# Altium footprint library ref-packages-longpad.PCBLIB: 1527 footprints (part 74 of 103)
Each footprint in its own frame and in the unit in brackets; x right, y up, seen from the top. Pads: shape width x height; smd on the part's side, far side on the other; paste and mask are expansions set on the pad; w line width, h text height; cw(c..) or ccw(c..) is an arc to the next point about the centre after c.
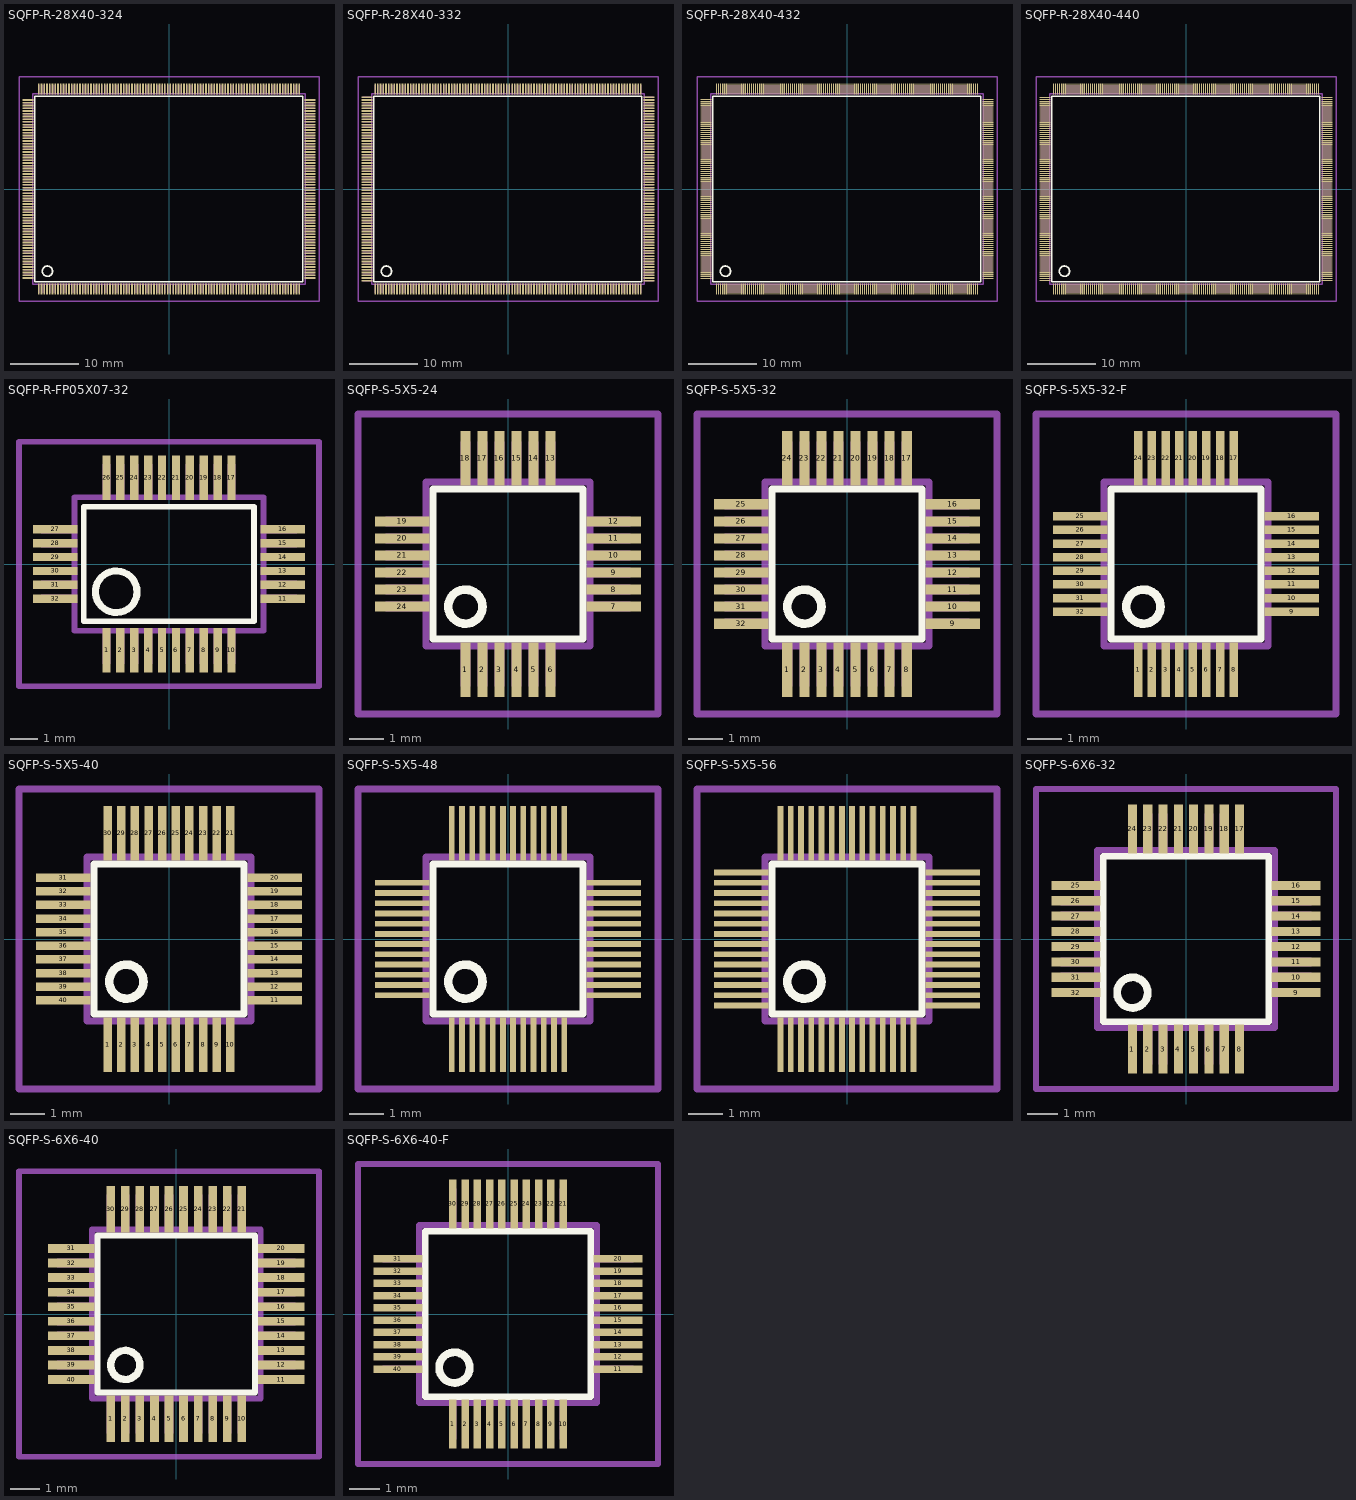
[diagram p73: the footprints below, top view; thin cyan lines are the x and y axes]

## SQFP-R-28X40-324 [mm]
pads (324):
  rect 0.25x1.6 smd: 1(-19,-14.6) 2(-18.6,-14.6) 3(-18.2,-14.6) 4(-17.8,-14.6) 5(-17.4,-14.6) 6(-17,-14.6) 7(-16.6,-14.6) 8(-16.2,-14.6) 9(-15.8,-14.6) 10(-15.4,-14.6) 11(-15,-14.6) 12(-14.6,-14.6) 13(-14.2,-14.6) 14(-13.8,-14.6) 15(-13.4,-14.6) 16(-13,-14.6) 17(-12.6,-14.6) 18(-12.2,-14.6) 19(-11.8,-14.6) 20(-11.4,-14.6) 21(-11,-14.6) 22(-10.6,-14.6) 23(-10.2,-14.6) 24(-9.8,-14.6) 25(-9.4,-14.6) 26(-9,-14.6) 27(-8.6,-14.6) 28(-8.2,-14.6) 29(-7.8,-14.6) 30(-7.4,-14.6) 31(-4.6,-14.6) 32(-7,-14.6) 33(-6.6,-14.6) 34(-6.2,-14.6) 35(-5.8,-14.6) 36(-5.4,-14.6) 37(-5,-14.6) 38(-4.2,-14.6) 39(-3.8,-14.6) 40(-3.4,-14.6) 41(-3,-14.6) 42(-2.6,-14.6) 43(-2.2,-14.6) 44(-1.8,-14.6) 45(-1.4,-14.6) 46(-1,-14.6) 47(-0.6,-14.6) 48(-0.2,-14.6) 49(0.2,-14.6) 50(0.6,-14.6) 51(1,-14.6) 52(1.4,-14.6) 53(1.8,-14.6) 54(2.2,-14.6) 55(2.6,-14.6) 56(3,-14.6) 57(3.4,-14.6) 58(3.8,-14.6) 59(4.2,-14.6) 60(4.6,-14.6) 61(5,-14.6) 62(5.4,-14.6) 63(5.8,-14.6) 64(6.2,-14.6) 65(6.6,-14.6) 66(7,-14.6) 67(7.4,-14.6) 68(7.8,-14.6) 69(8.2,-14.6) 70(8.6,-14.6) 71(9,-14.6) 72(9.4,-14.6) 73(9.8,-14.6) 74(10.2,-14.6) 75(10.6,-14.6) 76(11,-14.6) 77(11.4,-14.6) 78(11.8,-14.6) 79(12.2,-14.6) 80(12.6,-14.6) 81(13,-14.6) 82(13.4,-14.6) 83(13.8,-14.6) 84(14.2,-14.6) 85(14.6,-14.6) 86(15,-14.6) 87(15.4,-14.6) 88(15.8,-14.6) 89(16.2,-14.6) 90(16.6,-14.6) 91(17,-14.6) 92(17.4,-14.6) 93(17.8,-14.6) 94(18.2,-14.6) 95(18.6,-14.6) 96(19,-14.6) 163(19,14.6) 164(18.6,14.6) 165(18.2,14.6) 166(17.8,14.6) 167(17.4,14.6) 168(17,14.6) 169(16.6,14.6) 170(16.2,14.6) 171(15.8,14.6) 172(15.4,14.6) 173(15,14.6) 174(14.6,14.6) 175(14.2,14.6) 176(13.8,14.6) 177(13.4,14.6) 178(13,14.6) 179(12.6,14.6) 180(12.2,14.6) 181(11.8,14.6) 182(11.4,14.6) 183(11,14.6) 184(10.6,14.6) 185(10.2,14.6) 186(9.8,14.6) 187(9.4,14.6) 188(9,14.6) 189(8.6,14.6) 190(8.2,14.6) 191(7.8,14.6) 192(7.4,14.6) 193(7,14.6) 194(6.6,14.6) 195(6.2,14.6) 196(5.8,14.6) 197(5.4,14.6) 198(5,14.6) 199(4.6,14.6) 200(4.2,14.6) 201(3.8,14.6) 202(3.4,14.6) 203(3,14.6) 204(2.6,14.6) 205(2.2,14.6) 206(1.8,14.6) 207(1.4,14.6) 208(1,14.6) 209(0.6,14.6) 210(0.2,14.6) 211(-0.2,14.6) 212(-0.6,14.6) 213(-1,14.6) 214(-1.4,14.6) 215(-1.8,14.6) 216(-2.2,14.6) 217(-2.6,14.6) 218(-3,14.6) 219(-3.4,14.6) 220(-3.8,14.6) 221(-4.2,14.6) 222(-4.6,14.6) 223(-5,14.6) 224(-5.4,14.6) 225(-5.8,14.6) 226(-6.2,14.6) 227(-6.6,14.6) 228(-7,14.6) 229(-7.4,14.6) 230(-7.8,14.6) 231(-8.2,14.6) 232(-8.6,14.6) 233(-9,14.6) 234(-9.4,14.6) 235(-9.8,14.6) 236(-10.2,14.6) 237(-10.6,14.6) 238(-11,14.6) 239(-11.4,14.6) 240(-11.8,14.6) 241(-12.2,14.6) 242(-12.6,14.6) 243(-13,14.6) 244(-13.4,14.6) 245(-13.8,14.6) 246(-14.2,14.6) 247(-14.6,14.6) 248(-15,14.6) 249(-15.4,14.6) 250(-15.8,14.6) 251(-16.2,14.6) 252(-16.6,14.6) 253(-17,14.6) 254(-17.4,14.6) 255(-17.8,14.6) 256(-18.2,14.6) 257(-18.6,14.6) 258(-19,14.6)
  rect 1.6x0.25 smd: 97(20.6,-13) 98(20.6,-12.6) 99(20.6,-12.2) 100(20.6,-11.8) 101(20.6,-11.4) 102(20.6,-11) 103(20.6,-10.6) 104(20.6,-10.2) 105(20.6,-9.8) 106(20.6,-9.4) 107(20.6,-9) 108(20.6,-8.6) 109(20.6,-8.2) 110(20.6,-7.8) 111(20.6,-7.4) 112(20.6,-7) 113(20.6,-6.6) 114(20.6,-6.2) 115(20.6,-5.8) 116(20.6,-5.4) 117(20.6,-5) 118(20.6,-4.6) 119(20.6,-4.2) 120(20.6,-3.8) 121(20.6,-3.4) 122(20.6,-3) 123(20.6,-2.6) 124(20.6,-2.2) 125(20.6,-1.8) 126(20.6,-1.4) 127(20.6,-1) 128(20.6,-0.6) 129(20.6,-0.2) 130(20.6,0.2) 131(20.6,0.6) 132(20.6,1) 133(20.6,1.4) 134(20.6,1.8) 135(20.6,2.2) 136(20.6,2.6) 137(20.6,3) 138(20.6,3.4) 139(20.6,3.8) 140(20.6,4.2) 141(20.6,4.6) 142(20.6,5) 143(20.6,5.4) 144(20.6,5.8) 145(20.6,6.2) 146(20.6,6.6) 147(20.6,7) 148(20.6,7.4) 149(20.6,7.8) 150(20.6,8.2) 151(20.6,8.6) 152(20.6,9) 153(20.6,9.4) 154(20.6,9.8) 155(20.6,10.2) 156(20.6,10.6) 157(20.6,11) 158(20.6,11.4) 159(20.6,11.8) 160(20.6,12.2) 161(20.6,12.6) 162(20.6,13) 259(-20.6,13) 260(-20.6,12.6) 261(-20.6,12.2) 262(-20.6,11.8) 263(-20.6,11.4) 264(-20.6,11) 265(-20.6,10.6) 266(-20.6,10.2) 267(-20.6,9.8) 268(-20.6,9.4) 269(-20.6,9) 270(-20.6,8.6) 271(-20.6,8.2) 272(-20.6,7.8) 273(-20.6,7.4) 274(-20.6,7) 275(-20.6,6.6) 276(-20.6,6.2) 277(-20.6,5.8) 278(-20.6,5.4) 279(-20.6,5) 280(-20.6,4.6) 281(-20.6,4.2) 282(-20.6,3.8) 283(-20.6,3.4) 284(-20.6,3) 285(-20.6,2.6) 286(-20.6,2.2) 287(-20.6,1.8) 288(-20.6,1.4) 289(-20.6,1) 290(-20.6,0.6) 291(-20.6,0.2) 292(-20.6,-0.2) 293(-20.6,-0.6) 294(-20.6,-1) 295(-20.6,-1.4) 296(-20.6,-1.8) 297(-20.6,-2.2) 298(-20.6,-2.6) 299(-20.6,-3) 300(-20.6,-3.4) 301(-20.6,-3.8) 302(-20.6,-4.2) 303(-20.6,-4.6) 304(-20.6,-5) 305(-20.6,-5.4) 306(-20.6,-5.8) 307(-20.6,-6.2) 308(-20.6,-6.6) 309(-20.6,-7) 310(-20.6,-7.4) 311(-20.6,-7.8) 312(-20.6,-8.2) 313(-20.6,-8.6) 314(-20.6,-9) 315(-20.6,-9.4) 316(-20.6,-9.8) 317(-20.6,-10.2) 318(-20.6,-10.6) 319(-20.6,-11) 320(-20.6,-11.4) 321(-20.6,-11.8) 322(-20.6,-12.2) 323(-20.6,-12.6) 324(-20.6,-13)
Top Overlay:
  circle w0.254: c-17.75,-12 r0.75
  lines w0.203: -19.57,-13.56 19.56,-13.56 19.56,13.56 -19.57,13.56 -19.57,-13.56
Mechanical 16:
  drawing of 328 lines, arcs and shapes, not listed
Mechanical 27:
  lines w0.2: -21.9,-16.4 -21.9,16.4 21.9,16.4 21.9,-16.4 -21.9,-16.4

## SQFP-R-28X40-332 [mm]
pads (332):
  rect 0.25x1.6 smd: 1(-19.4,-14.6) 2(-19,-14.6) 3(-18.6,-14.6) 4(-18.2,-14.6) 5(-17.8,-14.6) 6(-17.4,-14.6) 7(-17,-14.6) 8(-16.6,-14.6) 9(-16.2,-14.6) 10(-15.8,-14.6) 11(-15.4,-14.6) 12(-15,-14.6) 13(-14.6,-14.6) 14(-14.2,-14.6) 15(-13.8,-14.6) 16(-13.4,-14.6) 17(-13,-14.6) 18(-12.6,-14.6) 19(-12.2,-14.6) 20(-11.8,-14.6) 21(-11.4,-14.6) 22(-11,-14.6) 23(-10.6,-14.6) 24(-10.2,-14.6) 25(-9.8,-14.6) 26(-9.4,-14.6) 27(-9,-14.6) 28(-8.6,-14.6) 29(-8.2,-14.6) 30(-7.8,-14.6) 31(-5,-14.6) 32(-7.4,-14.6) 33(-7,-14.6) 34(-6.6,-14.6) 35(-6.2,-14.6) 36(-5.8,-14.6) 37(-5.4,-14.6) 38(-4.6,-14.6) 39(-4.2,-14.6) 40(-3.8,-14.6) 41(-3.4,-14.6) 42(-3,-14.6) 43(-2.6,-14.6) 44(-2.2,-14.6) 45(-1.8,-14.6) 46(-1.4,-14.6) 47(-1,-14.6) 48(-0.6,-14.6) 49(-0.2,-14.6) 50(0.2,-14.6) 51(0.6,-14.6) 52(1,-14.6) 53(1.4,-14.6) 54(1.8,-14.6) 55(2.2,-14.6) 56(2.6,-14.6) 57(3,-14.6) 58(3.4,-14.6) 59(3.8,-14.6) 60(4.2,-14.6) 61(4.6,-14.6) 62(5,-14.6) 63(5.4,-14.6) 64(5.8,-14.6) 65(6.2,-14.6) 66(6.6,-14.6) 67(7,-14.6) 68(7.4,-14.6) 69(7.8,-14.6) 70(8.2,-14.6) 71(8.6,-14.6) 72(9,-14.6) 73(9.4,-14.6) 74(9.8,-14.6) 75(10.2,-14.6) 76(10.6,-14.6) 77(11,-14.6) 78(11.4,-14.6) 79(11.8,-14.6) 80(12.2,-14.6) 81(12.6,-14.6) 82(13,-14.6) 83(13.4,-14.6) 84(13.8,-14.6) 85(14.2,-14.6) 86(14.6,-14.6) 87(15,-14.6) 88(15.4,-14.6) 89(15.8,-14.6) 90(16.2,-14.6) 91(16.6,-14.6) 92(17,-14.6) 93(17.4,-14.6) 94(17.8,-14.6) 95(18.2,-14.6) 96(18.6,-14.6) 97(19,-14.6) 98(19.4,-14.6) 167(19.4,14.6) 168(19,14.6) 169(18.6,14.6) 170(18.2,14.6) 171(17.8,14.6) 172(17.4,14.6) 173(17,14.6) 174(16.6,14.6) 175(16.2,14.6) 176(15.8,14.6) 177(15.4,14.6) 178(15,14.6) 179(14.6,14.6) 180(14.2,14.6) 181(13.8,14.6) 182(13.4,14.6) 183(13,14.6) 184(12.6,14.6) 185(12.2,14.6) 186(11.8,14.6) 187(11.4,14.6) 188(11,14.6) 189(10.6,14.6) 190(10.2,14.6) 191(9.8,14.6) 192(9.4,14.6) 193(9,14.6) 194(8.6,14.6) 195(8.2,14.6) 196(7.8,14.6) 197(7.4,14.6) 198(7,14.6) 199(6.6,14.6) 200(6.2,14.6) 201(5.8,14.6) 202(5.4,14.6) 203(5,14.6) 204(4.6,14.6) 205(4.2,14.6) 206(3.8,14.6) 207(3.4,14.6) 208(3,14.6) 209(2.6,14.6) 210(2.2,14.6) 211(1.8,14.6) 212(1.4,14.6) 213(1,14.6) 214(0.6,14.6) 215(0.2,14.6) 216(-0.2,14.6) 217(-0.6,14.6) 218(-1,14.6) 219(-1.4,14.6) 220(-1.8,14.6) 221(-2.2,14.6) 222(-2.6,14.6) 223(-3,14.6) 224(-3.4,14.6) 225(-3.8,14.6) 226(-4.2,14.6) 227(-4.6,14.6) 228(-5,14.6) 229(-5.4,14.6) 230(-5.8,14.6) 231(-6.2,14.6) 232(-6.6,14.6) 233(-7,14.6) 234(-7.4,14.6) 235(-7.8,14.6) 236(-8.2,14.6) 237(-8.6,14.6) 238(-9,14.6) 239(-9.4,14.6) 240(-9.8,14.6) 241(-10.2,14.6) 242(-10.6,14.6) 243(-11,14.6) 244(-11.4,14.6) 245(-11.8,14.6) 246(-12.2,14.6) 247(-12.6,14.6) 248(-13,14.6) 249(-13.4,14.6) 250(-13.8,14.6) 251(-14.2,14.6) 252(-14.6,14.6) 253(-15,14.6) 254(-15.4,14.6) 255(-15.8,14.6) 256(-16.2,14.6) 257(-16.6,14.6) 258(-17,14.6) 259(-17.4,14.6) 260(-17.8,14.6) 261(-18.2,14.6) 262(-18.6,14.6) 263(-19,14.6) 264(-19.4,14.6)
  rect 1.6x0.25 smd: 99(20.6,-13.4) 100(20.6,-13) 101(20.6,-12.6) 102(20.6,-12.2) 103(20.6,-11.8) 104(20.6,-11.4) 105(20.6,-11) 106(20.6,-10.6) 107(20.6,-10.2) 108(20.6,-9.8) 109(20.6,-9.4) 110(20.6,-9) 111(20.6,-8.6) 112(20.6,-8.2) 113(20.6,-7.8) 114(20.6,-7.4) 115(20.6,-7) 116(20.6,-6.6) 117(20.6,-6.2) 118(20.6,-5.8) 119(20.6,-5.4) 120(20.6,-5) 121(20.6,-4.6) 122(20.6,-4.2) 123(20.6,-3.8) 124(20.6,-3.4) 125(20.6,-3) 126(20.6,-2.6) 127(20.6,-2.2) 128(20.6,-1.8) 129(20.6,-1.4) 130(20.6,-1) 131(20.6,-0.6) 132(20.6,-0.2) 133(20.6,0.2) 134(20.6,0.6) 135(20.6,1) 136(20.6,1.4) 137(20.6,1.8) 138(20.6,2.2) 139(20.6,2.6) 140(20.6,3) 141(20.6,3.4) 142(20.6,3.8) 143(20.6,4.2) 144(20.6,4.6) 145(20.6,5) 146(20.6,5.4) 147(20.6,5.8) 148(20.6,6.2) 149(20.6,6.6) 150(20.6,7) 151(20.6,7.4) 152(20.6,7.8) 153(20.6,8.2) 154(20.6,8.6) 155(20.6,9) 156(20.6,9.4) 157(20.6,9.8) 158(20.6,10.2) 159(20.6,10.6) 160(20.6,11) 161(20.6,11.4) 162(20.6,11.8) 163(20.6,12.2) 164(20.6,12.6) 165(20.6,13) 166(20.6,13.4) 265(-20.6,13.4) 266(-20.6,13) 267(-20.6,12.6) 268(-20.6,12.2) 269(-20.6,11.8) 270(-20.6,11.4) 271(-20.6,11) 272(-20.6,10.6) 273(-20.6,10.2) 274(-20.6,9.8) 275(-20.6,9.4) 276(-20.6,9) 277(-20.6,8.6) 278(-20.6,8.2) 279(-20.6,7.8) 280(-20.6,7.4) 281(-20.6,7) 282(-20.6,6.6) 283(-20.6,6.2) 284(-20.6,5.8) 285(-20.6,5.4) 286(-20.6,5) 287(-20.6,4.6) 288(-20.6,4.2) 289(-20.6,3.8) 290(-20.6,3.4) 291(-20.6,3) 292(-20.6,2.6) 293(-20.6,2.2) 294(-20.6,1.8) 295(-20.6,1.4) 296(-20.6,1) 297(-20.6,0.6) 298(-20.6,0.2) 299(-20.6,-0.2) 300(-20.6,-0.6) 301(-20.6,-1) 302(-20.6,-1.4) 303(-20.6,-1.8) 304(-20.6,-2.2) 305(-20.6,-2.6) 306(-20.6,-3) 307(-20.6,-3.4) 308(-20.6,-3.8) 309(-20.6,-4.2) 310(-20.6,-4.6) 311(-20.6,-5) 312(-20.6,-5.4) 313(-20.6,-5.8) 314(-20.6,-6.2) 315(-20.6,-6.6) 316(-20.6,-7) 317(-20.6,-7.4) 318(-20.6,-7.8) 319(-20.6,-8.2) 320(-20.6,-8.6) 321(-20.6,-9) 322(-20.6,-9.4) 323(-20.6,-9.8) 324(-20.6,-10.2) 325(-20.6,-10.6) 326(-20.6,-11) 327(-20.6,-11.4) 328(-20.6,-11.8) 329(-20.6,-12.2) 330(-20.6,-12.6) 331(-20.6,-13) 332(-20.6,-13.4)
Top Overlay:
  circle w0.254: c-17.75,-12 r0.75
  lines w0.203: -19.57,-13.56 19.56,-13.56 19.56,13.56 -19.57,13.56 -19.57,-13.56
Mechanical 16:
  drawing of 336 lines, arcs and shapes, not listed
Mechanical 27:
  lines w0.2: -21.9,-16.4 -21.9,16.4 21.9,16.4 21.9,-16.4 -21.9,-16.4

## SQFP-R-28X40-432 [mm]
pads (432):
  rect 0.17x1.6 smd: 1(-19.05,-14.6) 2(-18.75,-14.6) 3(-18.45,-14.6) 4(-18.15,-14.6) 5(-17.85,-14.6) 6(-17.55,-14.6) 7(-17.25,-14.6) 8(-16.95,-14.6) 9(-16.65,-14.6) 10(-16.35,-14.6) 11(-16.05,-14.6) 12(-15.75,-14.6) 13(-15.45,-14.6) 14(-15.15,-14.6) 15(-14.85,-14.6) 16(-14.55,-14.6) 17(-14.25,-14.6) 18(-13.95,-14.6) 19(-13.65,-14.6) 20(-13.35,-14.6) 21(-13.05,-14.6) 22(-12.75,-14.6) 23(-12.45,-14.6) 24(-12.15,-14.6) 25(-11.85,-14.6) 26(-11.55,-14.6) 27(-11.25,-14.6) 28(-10.95,-14.6) 29(-10.65,-14.6) 30(-10.35,-14.6) 31(-10.05,-14.6) 32(-9.75,-14.6) 33(-9.45,-14.6) 34(-9.15,-14.6) 35(-8.85,-14.6) 36(-8.55,-14.6) 37(-8.25,-14.6) 38(-7.95,-14.6) 39(-7.65,-14.6) 40(-7.35,-14.6) 41(-7.05,-14.6) 42(-6.75,-14.6) 43(-6.45,-14.6) 44(-6.15,-14.6) 45(-5.85,-14.6) 46(-5.55,-14.6) 47(-5.25,-14.6) 48(-4.95,-14.6) 49(-4.65,-14.6) 50(-4.35,-14.6) 51(-4.05,-14.6) 52(-3.75,-14.6) 53(-3.45,-14.6) 54(-3.15,-14.6) 55(-2.85,-14.6) 56(-2.55,-14.6) 57(-2.25,-14.6) 58(-1.95,-14.6) 59(-1.65,-14.6) 60(-1.35,-14.6) 61(-1.05,-14.6) 62(-0.75,-14.6) 63(-0.45,-14.6) 64(-0.15,-14.6) 65(0.15,-14.6) 66(0.45,-14.6) 67(0.75,-14.6) 68(1.05,-14.6) 69(1.35,-14.6) 70(1.65,-14.6) 71(1.95,-14.6) 72(2.25,-14.6) 73(2.55,-14.6) 74(2.85,-14.6) 75(3.15,-14.6) 76(3.45,-14.6) 77(3.75,-14.6) 78(4.05,-14.6) 79(4.35,-14.6) 80(4.65,-14.6) 81(4.95,-14.6) 82(5.25,-14.6) 83(5.55,-14.6) 84(5.85,-14.6) 85(6.15,-14.6) 86(6.45,-14.6) 87(6.75,-14.6) 88(7.05,-14.6) 89(7.35,-14.6) 90(7.65,-14.6) 91(7.95,-14.6) 92(8.25,-14.6) 93(8.55,-14.6) 94(8.85,-14.6) 95(9.15,-14.6) 96(9.45,-14.6) 97(9.75,-14.6) 98(10.05,-14.6) 99(10.35,-14.6) 100(10.65,-14.6) 101(10.95,-14.6) 102(11.25,-14.6) 103(11.55,-14.6) 104(11.85,-14.6) 105(12.15,-14.6) 106(12.45,-14.6) 107(12.75,-14.6) 108(13.05,-14.6) 109(13.35,-14.6) 110(13.65,-14.6) 111(13.95,-14.6) 112(14.25,-14.6) 113(14.55,-14.6) 114(14.85,-14.6) 115(15.15,-14.6) 116(15.45,-14.6) 117(15.75,-14.6) 118(16.05,-14.6) 119(16.35,-14.6) 120(16.65,-14.6) 121(16.95,-14.6) 122(17.25,-14.6) 123(17.55,-14.6) 124(17.85,-14.6) 125(18.15,-14.6) 126(18.45,-14.6) 127(18.75,-14.6) 128(19.05,-14.6) 217(19.05,14.6) 218(18.75,14.6) 219(18.45,14.6) 220(18.15,14.6) 221(17.85,14.6) 222(17.55,14.6) 223(17.25,14.6) 224(16.95,14.6) 225(16.65,14.6) 226(16.35,14.6) 227(16.05,14.6) 228(15.75,14.6) 229(15.45,14.6) 230(15.15,14.6) 231(14.85,14.6) 232(14.55,14.6) 233(14.25,14.6) 234(13.95,14.6) 235(13.65,14.6) 236(13.35,14.6) 237(13.05,14.6) 238(12.75,14.6) 239(12.45,14.6) 240(12.15,14.6) 241(11.85,14.6) 242(11.55,14.6) 243(11.25,14.6) 244(10.95,14.6) 245(10.65,14.6) 246(10.35,14.6) 247(10.05,14.6) 248(9.75,14.6) 249(9.45,14.6) 250(9.15,14.6) 251(8.85,14.6) 252(8.55,14.6) 253(8.25,14.6) 254(7.95,14.6) 255(7.65,14.6) 256(7.35,14.6) 257(7.05,14.6) 258(6.75,14.6) 259(6.45,14.6) 260(6.15,14.6) 261(5.85,14.6) 262(5.55,14.6) 263(5.25,14.6) 264(4.95,14.6) 265(4.65,14.6) 266(4.35,14.6) 267(4.05,14.6) 268(3.75,14.6) 269(3.45,14.6) 270(3.15,14.6) 271(2.85,14.6) 272(2.55,14.6) 273(2.25,14.6) 274(1.95,14.6) 275(1.65,14.6) 276(1.35,14.6) 277(1.05,14.6) 278(0.75,14.6) 279(0.45,14.6) 280(0.15,14.6) 281(-0.15,14.6) 282(-0.45,14.6) 283(-0.75,14.6) 284(-1.05,14.6) 285(-1.35,14.6) 286(-1.65,14.6) 287(-1.95,14.6) 288(-2.25,14.6) 289(-2.55,14.6) 290(-2.85,14.6) 291(-3.15,14.6) 292(-3.45,14.6) 293(-3.75,14.6) 294(-4.05,14.6) 295(-4.35,14.6) 296(-4.65,14.6) 297(-4.95,14.6) 298(-5.25,14.6) 299(-5.55,14.6) 300(-5.85,14.6) 301(-6.15,14.6) 302(-6.45,14.6) 303(-6.75,14.6) 304(-7.05,14.6) 305(-7.35,14.6) 306(-7.65,14.6) 307(-7.95,14.6) 308(-8.25,14.6) 309(-8.55,14.6) 310(-8.85,14.6) 311(-9.15,14.6) 312(-9.45,14.6) 313(-9.75,14.6) 314(-10.05,14.6) 315(-10.35,14.6) 316(-10.65,14.6) 317(-10.95,14.6) 318(-11.25,14.6) 319(-11.55,14.6) 320(-11.85,14.6) 321(-12.15,14.6) 322(-12.45,14.6) 323(-12.75,14.6) 324(-13.05,14.6) 325(-13.35,14.6) 326(-13.65,14.6) 327(-13.95,14.6) 328(-14.25,14.6) 329(-14.55,14.6) 330(-14.85,14.6) 331(-15.15,14.6) 332(-15.45,14.6) 333(-15.75,14.6) 334(-16.05,14.6) 335(-16.35,14.6) 336(-16.65,14.6) 337(-16.95,14.6) 338(-17.25,14.6) 339(-17.55,14.6) 340(-17.85,14.6) 341(-18.15,14.6) 342(-18.45,14.6) 343(-18.75,14.6) 344(-19.05,14.6)
  rect 1.6x0.17 smd: 129(20.6,-13.05) 130(20.6,-12.75) 131(20.6,-12.45) 132(20.6,-12.15) 133(20.6,-11.85) 134(20.6,-11.55) 135(20.6,-11.25) 136(20.6,-10.95) 137(20.6,-10.65) 138(20.6,-10.35) 139(20.6,-10.05) 140(20.6,-9.75) 141(20.6,-9.45) 142(20.6,-9.15) 143(20.6,-8.85) 144(20.6,-8.55) 145(20.6,-8.25) 146(20.6,-7.95) 147(20.6,-7.65) 148(20.6,-7.35) 149(20.6,-7.05) 150(20.6,-6.75) 151(20.6,-6.45) 152(20.6,-6.15) 153(20.6,-5.85) 154(20.6,-5.55) 155(20.6,-5.25) 156(20.6,-4.95) 157(20.6,-4.65) 158(20.6,-4.35) 159(20.6,-4.05) 160(20.6,-3.75) 161(20.6,-3.45) 162(20.6,-3.15) 163(20.6,-2.85) 164(20.6,-2.55) 165(20.6,-2.25) 166(20.6,-1.95) 167(20.6,-1.65) 168(20.6,-1.35) 169(20.6,-1.05) 170(20.6,-0.75) 171(20.6,-0.45) 172(20.6,-0.15) 173(20.6,0.15) 174(20.6,0.45) 175(20.6,0.75) 176(20.6,1.05) 177(20.6,1.35) 178(20.6,1.65) 179(20.6,1.95) 180(20.6,2.25) 181(20.6,2.55) 182(20.6,2.85) 183(20.6,3.15) 184(20.6,3.45) 185(20.6,3.75) 186(20.6,4.05) 187(20.6,4.35) 188(20.6,4.65) 189(20.6,4.95) 190(20.6,5.25) 191(20.6,5.55) 192(20.6,5.85) 193(20.6,6.15) 194(20.6,6.45) 195(20.6,6.75) 196(20.6,7.05) 197(20.6,7.35) 198(20.6,7.65) 199(20.6,7.95) 200(20.6,8.25) 201(20.6,8.55) 202(20.6,8.85) 203(20.6,9.15) 204(20.6,9.45) 205(20.6,9.75) 206(20.6,10.05) 207(20.6,10.35) 208(20.6,10.65) 209(20.6,10.95) 210(20.6,11.25) 211(20.6,11.55) 212(20.6,11.85) 213(20.6,12.15) 214(20.6,12.45) 215(20.6,12.75) 216(20.6,13.05) 345(-20.6,13.05) 346(-20.6,12.75) 347(-20.6,12.45) 348(-20.6,12.15) 349(-20.6,11.85) 350(-20.6,11.55) 351(-20.6,11.25) 352(-20.6,10.95) 353(-20.6,10.65) 354(-20.6,10.35) 355(-20.6,10.05) 356(-20.6,9.75) 357(-20.6,9.45) 358(-20.6,9.15) 359(-20.6,8.85) 360(-20.6,8.55) 361(-20.6,8.25) 362(-20.6,7.95) 363(-20.6,7.65) 364(-20.6,7.35) 365(-20.6,7.05) 366(-20.6,6.75) 367(-20.6,6.45) 368(-20.6,6.15) 369(-20.6,5.85) 370(-20.6,5.55) 371(-20.6,5.25) 372(-20.6,4.95) 373(-20.6,4.65) 374(-20.6,4.35) 375(-20.6,4.05) 376(-20.6,3.75) 377(-20.6,3.45) 378(-20.6,3.15) 379(-20.6,2.85) 380(-20.6,2.55) 381(-20.6,2.25) 382(-20.6,1.95) 383(-20.6,1.65) 384(-20.6,1.35) 385(-20.6,1.05) 386(-20.6,0.75) 387(-20.6,0.45) 388(-20.6,0.15) 389(-20.6,-0.15) 390(-20.6,-0.45) 391(-20.6,-0.75) 392(-20.6,-1.05) 393(-20.6,-1.35) 394(-20.6,-1.65) 395(-20.6,-1.95) 396(-20.6,-2.25) 397(-20.6,-2.55) 398(-20.6,-2.85) 399(-20.6,-3.15) 400(-20.6,-3.45) 401(-20.6,-3.75) 402(-20.6,-4.05) 403(-20.6,-4.35) 404(-20.6,-4.65) 405(-20.6,-4.95) 406(-20.6,-5.25) 407(-20.6,-5.55) 408(-20.6,-5.85) 409(-20.6,-6.15) 410(-20.6,-6.45) 411(-20.6,-6.75) 412(-20.6,-7.05) 413(-20.6,-7.35) 414(-20.6,-7.65) 415(-20.6,-7.95) 416(-20.6,-8.25) 417(-20.6,-8.55) 418(-20.6,-8.85) 419(-20.6,-9.15) 420(-20.6,-9.45) 421(-20.6,-9.75) 422(-20.6,-10.05) 423(-20.6,-10.35) 424(-20.6,-10.65) 425(-20.6,-10.95) 426(-20.6,-11.25) 427(-20.6,-11.55) 428(-20.6,-11.85) 429(-20.6,-12.15) 430(-20.6,-12.45) 431(-20.6,-12.75) 432(-20.6,-13.05)
Top Overlay:
  circle w0.254: c-17.75,-12 r0.75
  lines w0.203: -19.57,-13.56 19.56,-13.56 19.56,13.56 -19.57,13.56 -19.57,-13.56
Mechanical 16:
  drawing of 436 lines, arcs and shapes, not listed
Mechanical 27:
  lines w0.2: -21.9,-16.4 -21.9,16.4 21.9,16.4 21.9,-16.4 -21.9,-16.4

## SQFP-R-28X40-440 [mm]
pads (440):
  rect 0.17x1.6 smd: 1(-19.35,-14.6) 2(-19.05,-14.6) 3(-18.75,-14.6) 4(-18.45,-14.6) 5(-18.15,-14.6) 6(-17.85,-14.6) 7(-17.55,-14.6) 8(-17.25,-14.6) 9(-16.95,-14.6) 10(-16.65,-14.6) 11(-16.35,-14.6) 12(-16.05,-14.6) 13(-15.75,-14.6) 14(-15.45,-14.6) 15(-15.15,-14.6) 16(-14.85,-14.6) 17(-14.55,-14.6) 18(-14.25,-14.6) 19(-13.95,-14.6) 20(-13.65,-14.6) 21(-13.35,-14.6) 22(-13.05,-14.6) 23(-12.75,-14.6) 24(-12.45,-14.6) 25(-12.15,-14.6) 26(-11.85,-14.6) 27(-11.55,-14.6) 28(-11.25,-14.6) 29(-10.95,-14.6) 30(-10.65,-14.6) 31(-10.35,-14.6) 32(-10.05,-14.6) 33(-9.75,-14.6) 34(-9.45,-14.6) 35(-9.15,-14.6) 36(-8.85,-14.6) 37(-8.55,-14.6) 38(-8.25,-14.6) 39(-7.95,-14.6) 40(-7.65,-14.6) 41(-7.35,-14.6) 42(-7.05,-14.6) 43(-6.75,-14.6) 44(-6.45,-14.6) 45(-6.15,-14.6) 46(-5.85,-14.6) 47(-5.55,-14.6) 48(-5.25,-14.6) 49(-4.95,-14.6) 50(-4.65,-14.6) 51(-4.35,-14.6) 52(-4.05,-14.6) 53(-3.75,-14.6) 54(-3.45,-14.6) 55(-3.15,-14.6) 56(-2.85,-14.6) 57(-2.55,-14.6) 58(-2.25,-14.6) 59(-1.95,-14.6) 60(-1.65,-14.6) 61(-1.35,-14.6) 62(-1.05,-14.6) 63(-0.75,-14.6) 64(-0.45,-14.6) 65(-0.15,-14.6) 66(0.15,-14.6) 67(0.45,-14.6) 68(0.75,-14.6) 69(1.05,-14.6) 70(1.35,-14.6) 71(1.65,-14.6) 72(1.95,-14.6) 73(2.25,-14.6) 74(2.55,-14.6) 75(2.85,-14.6) 76(3.15,-14.6) 77(3.45,-14.6) 78(3.75,-14.6) 79(4.05,-14.6) 80(4.35,-14.6) 81(4.65,-14.6) 82(4.95,-14.6) 83(5.25,-14.6) 84(5.55,-14.6) 85(5.85,-14.6) 86(6.15,-14.6) 87(6.45,-14.6) 88(6.75,-14.6) 89(7.05,-14.6) 90(7.35,-14.6) 91(7.65,-14.6) 92(7.95,-14.6) 93(8.25,-14.6) 94(8.55,-14.6) 95(8.85,-14.6) 96(9.15,-14.6) 97(9.45,-14.6) 98(9.75,-14.6) 99(10.05,-14.6) 100(10.35,-14.6) 101(10.65,-14.6) 102(10.95,-14.6) 103(11.25,-14.6) 104(11.55,-14.6) 105(11.85,-14.6) 106(12.15,-14.6) 107(12.45,-14.6) 108(12.75,-14.6) 109(13.05,-14.6) 110(13.35,-14.6) 111(13.65,-14.6) 112(13.95,-14.6) 113(14.25,-14.6) 114(14.55,-14.6) 115(14.85,-14.6) 116(15.15,-14.6) 117(15.45,-14.6) 118(15.75,-14.6) 119(16.05,-14.6) 120(16.35,-14.6) 121(16.65,-14.6) 122(16.95,-14.6) 123(17.25,-14.6) 124(17.55,-14.6) 125(17.85,-14.6) 126(18.15,-14.6) 127(18.45,-14.6) 128(18.75,-14.6) 129(19.05,-14.6) 130(19.35,-14.6) 221(19.35,14.6) 222(19.05,14.6) 223(18.75,14.6) 224(18.45,14.6) 225(18.15,14.6) 226(17.85,14.6) 227(17.55,14.6) 228(17.25,14.6) 229(16.95,14.6) 230(16.65,14.6) 231(16.35,14.6) 232(16.05,14.6) 233(15.75,14.6) 234(15.45,14.6) 235(15.15,14.6) 236(14.85,14.6) 237(14.55,14.6) 238(14.25,14.6) 239(13.95,14.6) 240(13.65,14.6) 241(13.35,14.6) 242(13.05,14.6) 243(12.75,14.6) 244(12.45,14.6) 245(12.15,14.6) 246(11.85,14.6) 247(11.55,14.6) 248(11.25,14.6) 249(10.95,14.6) 250(10.65,14.6) 251(10.35,14.6) 252(10.05,14.6) 253(9.75,14.6) 254(9.45,14.6) 255(9.15,14.6) 256(8.85,14.6) 257(8.55,14.6) 258(8.25,14.6) 259(7.95,14.6) 260(7.65,14.6) 261(7.35,14.6) 262(7.05,14.6) 263(6.75,14.6) 264(6.45,14.6) 265(6.15,14.6) 266(5.85,14.6) 267(5.55,14.6) 268(5.25,14.6) 269(4.95,14.6) 270(4.65,14.6) 271(4.35,14.6) 272(4.05,14.6) 273(3.75,14.6) 274(3.45,14.6) 275(3.15,14.6) 276(2.85,14.6) 277(2.55,14.6) 278(2.25,14.6) 279(1.95,14.6) 280(1.65,14.6) 281(1.35,14.6) 282(1.05,14.6) 283(0.75,14.6) 284(0.45,14.6) 285(0.15,14.6) 286(-0.15,14.6) 287(-0.45,14.6) 288(-0.75,14.6) 289(-1.05,14.6) 290(-1.35,14.6) 291(-1.65,14.6) 292(-1.95,14.6) 293(-2.25,14.6) 294(-2.55,14.6) 295(-2.85,14.6) 296(-3.15,14.6) 297(-3.45,14.6) 298(-3.75,14.6) 299(-4.05,14.6) 300(-4.35,14.6) 301(-4.65,14.6) 302(-4.95,14.6) 303(-5.25,14.6) 304(-5.55,14.6) 305(-5.85,14.6) 306(-6.15,14.6) 307(-6.45,14.6) 308(-6.75,14.6) 309(-7.05,14.6) 310(-7.35,14.6) 311(-7.65,14.6) 312(-7.95,14.6) 313(-8.25,14.6) 314(-8.55,14.6) 315(-8.85,14.6) 316(-9.15,14.6) 317(-9.45,14.6) 318(-9.75,14.6) 319(-10.05,14.6) 320(-10.35,14.6) 321(-10.65,14.6) 322(-10.95,14.6) 323(-11.25,14.6) 324(-11.55,14.6) 325(-11.85,14.6) 326(-12.15,14.6) 327(-12.45,14.6) 328(-12.75,14.6) 329(-13.05,14.6) 330(-13.35,14.6) 331(-13.65,14.6) 332(-13.95,14.6) 333(-14.25,14.6) 334(-14.55,14.6) 335(-14.85,14.6) 336(-15.15,14.6) 337(-15.45,14.6) 338(-15.75,14.6) 339(-16.05,14.6) 340(-16.35,14.6) 341(-16.65,14.6) 342(-16.95,14.6) 343(-17.25,14.6) 344(-17.55,14.6) 345(-17.85,14.6) 346(-18.15,14.6) 347(-18.45,14.6) 348(-18.75,14.6) 349(-19.05,14.6) 350(-19.35,14.6)
  rect 1.6x0.17 smd: 131(20.6,-13.35) 132(20.6,-13.05) 133(20.6,-12.75) 134(20.6,-12.45) 135(20.6,-12.15) 136(20.6,-11.85) 137(20.6,-11.55) 138(20.6,-11.25) 139(20.6,-10.95) 140(20.6,-10.65) 141(20.6,-10.35) 142(20.6,-10.05) 143(20.6,-9.75) 144(20.6,-9.45) 145(20.6,-9.15) 146(20.6,-8.85) 147(20.6,-8.55) 148(20.6,-8.25) 149(20.6,-7.95) 150(20.6,-7.65) 151(20.6,-7.35) 152(20.6,-7.05) 153(20.6,-6.75) 154(20.6,-6.45) 155(20.6,-6.15) 156(20.6,-5.85) 157(20.6,-5.55) 158(20.6,-5.25) 159(20.6,-4.95) 160(20.6,-4.65) 161(20.6,-4.35) 162(20.6,-4.05) 163(20.6,-3.75) 164(20.6,-3.45) 165(20.6,-3.15) 166(20.6,-2.85) 167(20.6,-2.55) 168(20.6,-2.25) 169(20.6,-1.95) 170(20.6,-1.65) 171(20.6,-1.35) 172(20.6,-1.05) 173(20.6,-0.75) 174(20.6,-0.45) 175(20.6,-0.15) 176(20.6,0.15) 177(20.6,0.45) 178(20.6,0.75) 179(20.6,1.05) 180(20.6,1.35) 181(20.6,1.65) 182(20.6,1.95) 183(20.6,2.25) 184(20.6,2.55) 185(20.6,2.85) 186(20.6,3.15) 187(20.6,3.45) 188(20.6,3.75) 189(20.6,4.05) 190(20.6,4.35) 191(20.6,4.65) 192(20.6,4.95) 193(20.6,5.25) 194(20.6,5.55) 195(20.6,5.85) 196(20.6,6.15) 197(20.6,6.45) 198(20.6,6.75) 199(20.6,7.05) 200(20.6,7.35) 201(20.6,7.65) 202(20.6,7.95) 203(20.6,8.25) 204(20.6,8.55) 205(20.6,8.85) 206(20.6,9.15) 207(20.6,9.45) 208(20.6,9.75) 209(20.6,10.05) 210(20.6,10.35) 211(20.6,10.65) 212(20.6,10.95) 213(20.6,11.25) 214(20.6,11.55) 215(20.6,11.85) 216(20.6,12.15) 217(20.6,12.45) 218(20.6,12.75) 219(20.6,13.05) 220(20.6,13.35) 351(-20.6,13.35) 352(-20.6,13.05) 353(-20.6,12.75) 354(-20.6,12.45) 355(-20.6,12.15) 356(-20.6,11.85) 357(-20.6,11.55) 358(-20.6,11.25) 359(-20.6,10.95) 360(-20.6,10.65) 361(-20.6,10.35) 362(-20.6,10.05) 363(-20.6,9.75) 364(-20.6,9.45) 365(-20.6,9.15) 366(-20.6,8.85) 367(-20.6,8.55) 368(-20.6,8.25) 369(-20.6,7.95) 370(-20.6,7.65) 371(-20.6,7.35) 372(-20.6,7.05) 373(-20.6,6.75) 374(-20.6,6.45) 375(-20.6,6.15) 376(-20.6,5.85) 377(-20.6,5.55) 378(-20.6,5.25) 379(-20.6,4.95) 380(-20.6,4.65) 381(-20.6,4.35) 382(-20.6,4.05) 383(-20.6,3.75) 384(-20.6,3.45) 385(-20.6,3.15) 386(-20.6,2.85) 387(-20.6,2.55) 388(-20.6,2.25) 389(-20.6,1.95) 390(-20.6,1.65) 391(-20.6,1.35) 392(-20.6,1.05) 393(-20.6,0.75) 394(-20.6,0.45) 395(-20.6,0.15) 396(-20.6,-0.15) 397(-20.6,-0.45) 398(-20.6,-0.75) 399(-20.6,-1.05) 400(-20.6,-1.35) 401(-20.6,-1.65) 402(-20.6,-1.95) 403(-20.6,-2.25) 404(-20.6,-2.55) 405(-20.6,-2.85) 406(-20.6,-3.15) 407(-20.6,-3.45) 408(-20.6,-3.75) 409(-20.6,-4.05) 410(-20.6,-4.35) 411(-20.6,-4.65) 412(-20.6,-4.95) 413(-20.6,-5.25) 414(-20.6,-5.55) 415(-20.6,-5.85) 416(-20.6,-6.15) 417(-20.6,-6.45) 418(-20.6,-6.75) 419(-20.6,-7.05) 420(-20.6,-7.35) 421(-20.6,-7.65) 422(-20.6,-7.95) 423(-20.6,-8.25) 424(-20.6,-8.55) 425(-20.6,-8.85) 426(-20.6,-9.15) 427(-20.6,-9.45) 428(-20.6,-9.75) 429(-20.6,-10.05) 430(-20.6,-10.35) 431(-20.6,-10.65) 432(-20.6,-10.95) 433(-20.6,-11.25) 434(-20.6,-11.55) 435(-20.6,-11.85) 436(-20.6,-12.15) 437(-20.6,-12.45) 438(-20.6,-12.75) 439(-20.6,-13.05) 440(-20.6,-13.35)